# Altium footprint library Cty1.PcbLib: 1378 footprints (part 75 of 87)
Each footprint in its own frame and in the unit in brackets; x right, y up, seen from the top. Pads: shape width x height; smd on the part's side, far side on the other; paste and mask are expansions set on the pad; w line width, h text height; cw(c..) or ccw(c..) is an arc to the next point about the centre after c.
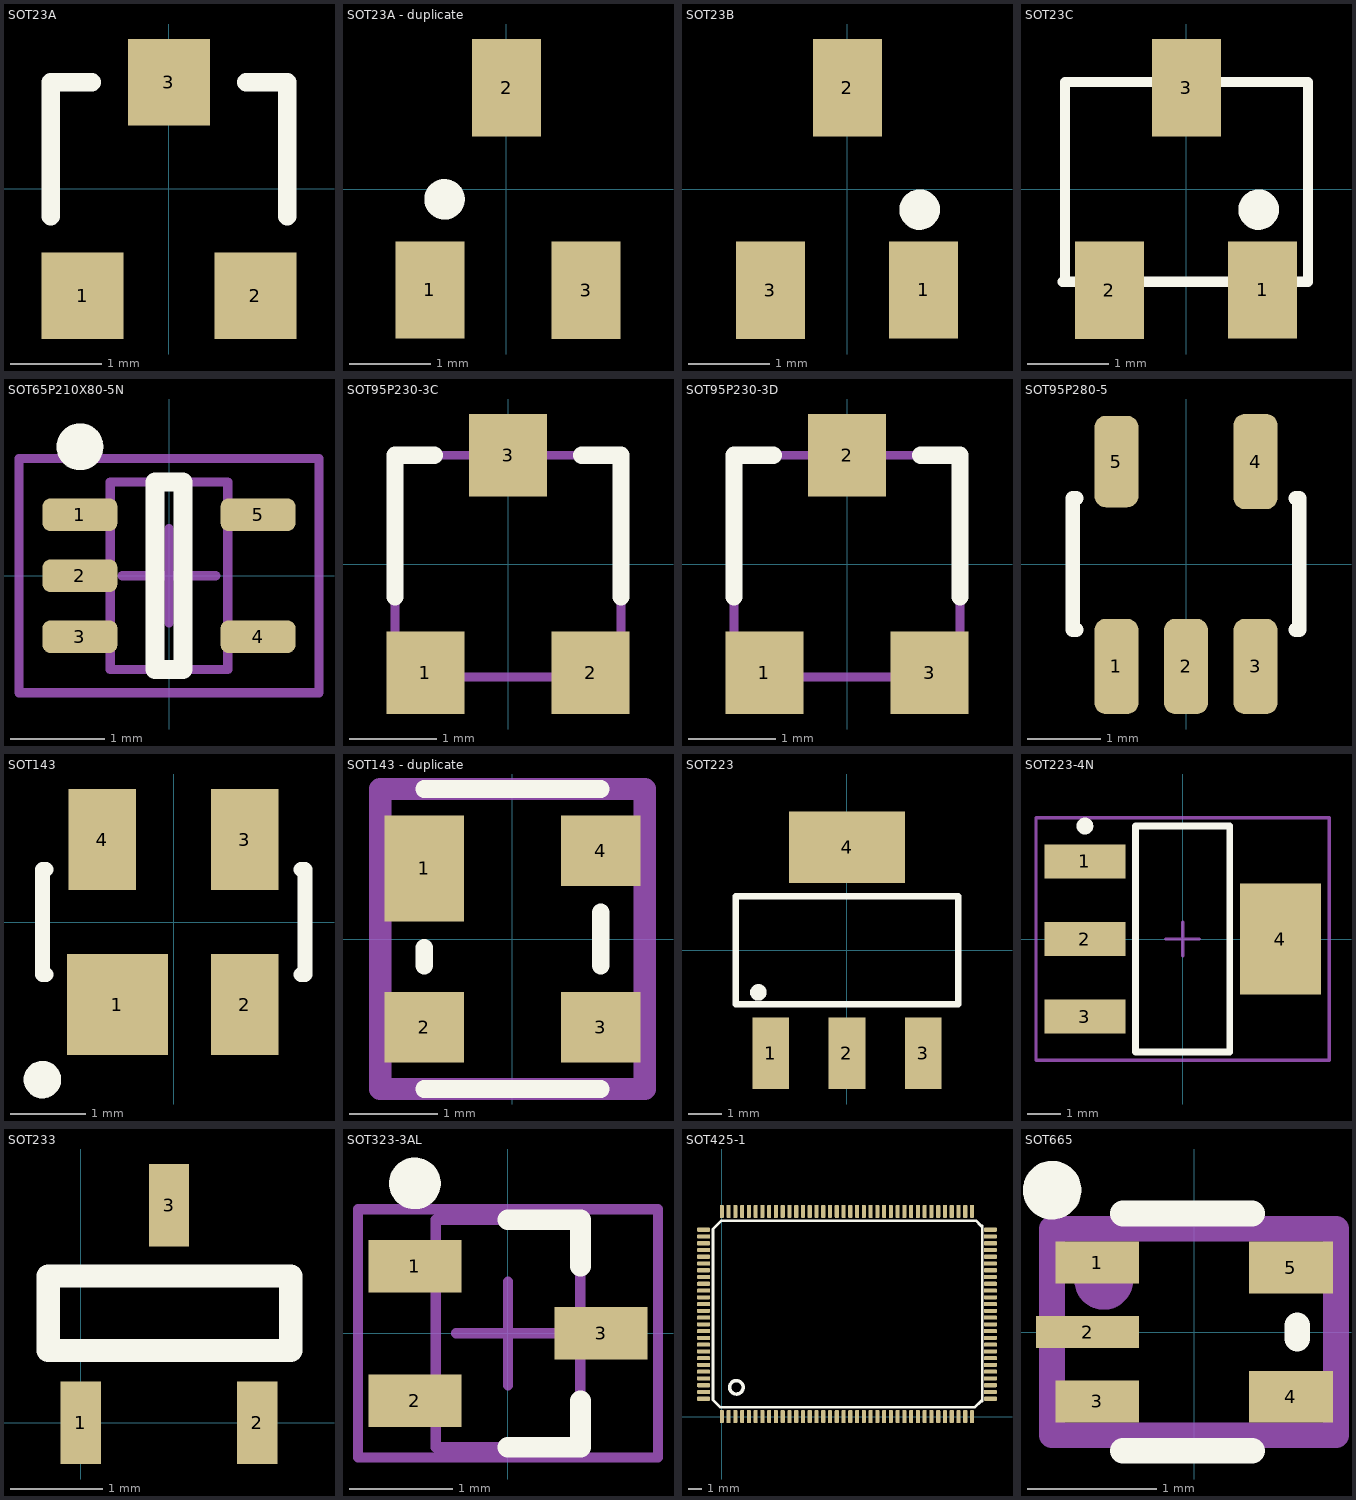
[diagram p74: the footprints below, top view; thin cyan lines are the x and y axes]

## SOT23A [mm] "SOT-23; 3 Leads; Body 3.0 x 2.5 mm, inc. leads (LxW max)"
height 1.2
pads (3):
  rect 0.9x0.95 smd: 1(-0.95,-1.175) 2(0.95,-1.175) 3(0,1.175)
Top Overlay:
  lines w0.2: -1.3,-0.3 -1.3,1.175 -0.85,1.175 ; 0.85,1.175 1.3,1.175 1.3,-0.3

## SOT23A - duplicate [mm] "SOT 23A"
height 1.27
pads (3):
  rect 0.85x1.2 smd: 1(-0.94,-1.245) 2(0.005,1.25) 3(0.985,-1.25)
Top Overlay:
  circle w0.25: c-0.76,-0.127 r0.125
3D body "SW3DPS-SOT-23-DEFAULT.STEP": height 1.06, standoff -0.04, extent -1.5,-1.301 1.5,1.199

## SOT23B [mm] "SOT 23B"
height 1.27
pads (3):
  rect 0.85x1.2 smd: 1(0.94,-1.245) 2(0,1.25) 3(-0.95,-1.25)
Top Overlay:
  circle w0.25: c0.891,-0.254 r0.125
3D body "SW3DPS-SOT-23-DEFAULT.STEP": height 1.06, standoff -0.04, extent -1.5,-1.301 1.5,1.199

## SOT23C [mm] "SOT 23C - 2-3-1 - BCE"
height 1.27
pads (3):
  rect 0.85x1.2 smd: 1(0.94,-1.245) 2(-0.95,-1.25) 3(0,1.25)
Top Overlay:
  circle w0.25: c0.891,-0.254 r0.125
  lines w0.127: -1.524,-1.143 -1.499,-1.143 -1.499,1.321 1.499,1.321 1.499,-1.143 -1.524,-1.143
3D body "SW3DPS-SOT-23-DEFAULT.STEP": height 1.06, standoff -0.04, extent -1.5,-1.174 1.5,1.326

## SOT65P210X80-5N [mm]
pads (5):
  rrect50% 0.8x0.35 smd: 1(-0.95,0.65) 2(-0.95,0) 3(-0.95,-0.65) 4(0.95,-0.65) 5(0.95,0.65)
Top Overlay:
  circle w0.25: c-0.95,1.375 r0.125
  lines w0.2: -0.15,-1 -0.15,1 0.15,1 0.15,-1 -0.15,-1
Mechanical 13:
  lines w0.1: -0.625,-1 -0.625,1 0.625,1 0.625,-1 -0.625,-1
Mechanical 15:
  lines w0.1: -0.5,0 0.5,0 ; 0,-0.5 0,0.5 ; -1.6,-1.25 -1.6,1.25 1.6,1.25 1.6,-1.25 -1.6,-1.25
3D body "SW3dPS-SOT280-5.STEP": height 0.57, standoff 0, extent -1.016,-0.993 0.902,0.993

## SOT95P230-3C [mm]
pads (3):
  rect 0.9x0.95 smd: 1(-0.95,-1.25) 2(0.95,-1.25) 3(0,1.25)
Top Overlay:
  lines w0.2: -1.3,-0.375 -1.3,1.25 -0.85,1.25 ; 0.85,1.25 1.3,1.25 1.3,-0.375
Mechanical 7:
  region: 1.225,-1.275 0.625,-1.275 0.625,-1.525 1.225,-1.525
  region: -0.625,-1.275 -1.225,-1.275 -1.225,-1.525 -0.625,-1.525
  rectangle: -0.3,1.25 0.3,1.5
  lines w0.1: -1.3,-1.3 1.3,-1.3 1.3,1.25 -1.3,1.25 -1.3,-1.3
  text ".Designator" at -1.2,0.75 h0.5
  text ".Comment" at -1.2,0.325 h0.5
3D body: height 0.13, standoff 0, extent -1.111,-1.175 -0.604,-0.465
3D body: height 0.38, standoff 0, extent -1.138,-0.465 1.174,0.73
3D body: height 0.13, standoff 0, extent 0.667,-1.175 1.174,-0.465
3D body: height 0.13, standoff 0, extent -0.236,0.73 0.271,1.44

## SOT95P230-3D [mm]
pads (3):
  rect 0.9x0.95 smd: 1(-0.95,-1.25) 2(0,1.25) 3(0.95,-1.25)
Top Overlay:
  lines w0.2: -1.3,-0.375 -1.3,1.25 -0.85,1.25 ; 0.85,1.25 1.3,1.25 1.3,-0.375
Mechanical 7:
  region: 1.225,-1.275 0.625,-1.275 0.625,-1.525 1.225,-1.525
  region: -0.625,-1.275 -1.225,-1.275 -1.225,-1.525 -0.625,-1.525
  rectangle: -0.3,1.25 0.3,1.5
  lines w0.1: -1.3,-1.3 1.3,-1.3 1.3,1.25 -1.3,1.25 -1.3,-1.3
  text ".Designator" at -1.2,0.75 h0.5
  text ".Comment" at -1.2,0.325 h0.5
3D body: height 0.13, standoff 0, extent -1.115,-1.254 -0.608,-0.543
3D body: height 0.38, standoff 0, extent -1.142,-0.543 1.171,0.651
3D body: height 0.13, standoff 0, extent 0.663,-1.254 1.17,-0.543
3D body: height 0.13, standoff 0, extent -0.239,0.651 0.268,1.362

## SOT95P280-5 [mm]
pads (5):
  rrect50% 0.6x1.3 smd: 1(-0.95,-1.4) 2(0,-1.4) 3(0.95,-1.4) 4(0.95,1.4)
  rrect50% 0.6x1.25 smd: 5(-0.95,1.4)
Top Overlay:
  lines w0.2: -1.5,-0.9 -1.55,-0.9 -1.55,0.9 -1.5,0.9 ; 1.5,-0.9 1.55,-0.9 1.55,0.9 1.5,0.9
3D body "SOT23-95P.STEP": height 0.77, standoff 0, extent -1.449,-1.45 1.45,1.35

## SOT143 [mm]
pads (4):
  rect 1.35x1.35 smd: 1(-0.75,-1.1)
  rect 0.9x1.35 smd: 2(0.95,-1.1) 3(0.95,1.1) 4(-0.95,1.1)
Top Overlay:
  circle w0.25: c-1.75,-2.1 r0.125
  lines w0.2: -1.7,-0.7 -1.75,-0.7 -1.75,0.7 -1.7,0.7 ; 1.7,-0.7 1.75,-0.7 1.75,0.7 1.7,0.7
3D body: height 0.2, standoff 0, extent 0.779,-1.464 1.125,-0.414
3D body: height 0.2, standoff 0, extent -1.166,-1.503 -0.82,-0.452
3D body: height 0.2, standoff 0, extent 0.784,0.408 1.13,1.459
3D body: height 0.2, standoff 0, extent -1.149,0.408 -0.803,1.459
3D body: height 0.8, standoff 0, extent -1.516,-0.878 1.514,0.931

## SOT143 - duplicate [mm]
pads (4):
  rect 0.9x1.2 smd: 1(-1,0.8)
  rect 0.9x0.8 smd: 2(-1,-1) 3(1,-1) 4(1,1)
Top Overlay:
  lines w0.2: -1,-1.7 1,-1.7 ; -1,-0.3 -1,-0.1 ; -1,1.7 1,1.7 ; 1,-0.3 1,0.3
Mechanical 16:
  circle w0.254: c-1,1.1 r0.1
  lines w0.254: -1.5,-1.7 1.5,-1.7 1.5,1.7 -1.5,1.7 -1.5,-1.7
Mechanical 29:
  text ".Designator" at -0.2,0.7 h0.6
3D body: height 1, standoff 0, extent -1,-1.7 1,1.7

## SOT223 [mm] "SOT-223/SC-73; 4 Leads; Body 6.7 x 7.3 mm, inc. leads (LxW max)"
height 1.8
pads (4):
  rect 1.1x2.15 smd: 1(-2.3,-3.1) 2(0,-3.1) 3(2.3,-3.1)
  rect 3.5x2.15 smd: 4(0,3.1)
Top Overlay:
  circle w0.25: c-2.665,-1.27 r0.125
  lines w0.2: -3.35,-1.625 -3.35,1.625 3.35,1.625 3.35,-1.625 -3.35,-1.625
3D body: height 2.54, standoff 0, extent -3.429,-1.651 3.429,1.651

## SOT223-4N [mm] "SOT223, 4-Leads, Body 6.5x3.5mm, Pitch 2.3mm, Lead Span 7mm, IPC Medium Density"
height 1.8
pads (4):
  rect 2.4x1 smd: 1(-2.9,2.3) 2(-2.9,0) 3(-2.9,-2.3)
  rect 2.4x3.3 smd: 4(2.9,0)
Top Overlay:
  circle w0.25: c-2.9,3.35 r0.125
  lines w0.2: -1.4,-3.35 1.4,-3.35 1.4,3.35 -1.4,3.35 -1.4,-3.35
Mechanical 15:
  lines w0.1: -0.5,0 0.5,0 ; 0,-0.5 0,0.5 ; -4.35,-3.6 4.35,-3.6 4.35,3.6 -4.35,3.6 -4.35,-3.6
3D body "SW3dPS-Regulator.STEP": height 1.72, standoff 0.02, extent -3.395,-3.274 3.496,3.226

## SOT233 [mm]
pads (3):
  rect 0.44x0.9 smd: 1(0,0) 2(1.92,0) 3(0.96,2.37)
Top Overlay:
  lines w0.254: -0.356,0.787 2.286,0.787 2.286,1.6 -0.356,1.6 -0.356,0.787
3D body "User Library-3-lead sot23-3.step": height 1.04, standoff 0.02, extent -0.495,-0.051 2.425,2.425

## SOT323-3AL [mm]
pads (3):
  rect 0.9x0.508 smd: 1(-0.9,0.65) 2(-0.9,-0.65) 3(0.9,0)
Top Overlay:
  circle w0.25: c-0.9,1.45 r0.125
  lines w0.2: 0,-1.1 0.7,-1.1 0.7,-0.65 ; 0,1.1 0.7,1.1 0.7,0.65
Mechanical 13:
  lines w0.1: -0.7,-1.1 0.7,-1.1 0.7,1.1 -0.7,1.1 -0.7,-1.1
Mechanical 15:
  lines w0.1: -0.5,0 0.5,0 ; 0,-0.5 0,0.5 ; -1.45,-1.2 1.45,-1.2 1.45,1.2 -1.45,1.2 -1.45,-1.2
3D body: height 1, standoff 0, extent -0.7,-1.1 0.7,1.1

## SOT425-1 [mm]
pads (128):
  rrect50% 0.305x0.975 smd mask+0.05: 1(0,0) 2(0.5,0) 3(1,0) 4(1.5,0) 5(2,0) 6(2.5,0) 7(3,0) 8(3.5,0) 9(4,0) 10(4.5,0) 11(5,0) 12(5.5,0) 13(6,0) 14(6.5,0) 15(7,0) 16(7.5,0) 17(8,0) 18(8.5,0) 19(9,0) 20(9.5,0) 21(10,0) 22(10.5,0) 23(11,0) 24(11.5,0) 25(12,0) 26(12.5,0) 27(13,0) 28(13.5,0) 29(14,0) 30(14.5,0) 31(15,0) 32(15.5,0) 33(16,0) 34(16.5,0) 35(17,0) 36(17.5,0) 37(18,0) 38(18.5,0) 65(18.5,15.172) 66(18,15.172) 67(17.5,15.172) 68(17,15.172) 69(16.5,15.172) 70(16,15.172) 71(15.5,15.172) 72(15,15.172) 73(14.5,15.172) 74(14,15.172) 75(13.5,15.172) 76(13,15.172) 77(12.5,15.172) 78(12,15.172) 79(11.5,15.172) 80(11,15.172) 81(10.5,15.172) 82(10,15.172) 83(9.5,15.172) 84(9,15.172) 85(8.5,15.172) 86(8,15.172) 87(7.5,15.172) 88(7,15.172) 89(6.5,15.172) 90(6,15.172) 91(5.5,15.172) 92(5,15.172) 93(4.5,15.172) 94(4,15.172) 95(3.5,15.172) 96(3,15.172) 97(2.5,15.172) 98(2,15.172) 99(1.5,15.172) 100(1,15.172) 101(0.5,15.172) 102(0,15.172)
  rrect50% 0.975x0.305 smd mask+0.05: 39(19.861,1.32) 40(19.861,1.82) 41(19.861,2.32) 42(19.861,2.82) 43(19.861,3.32) 44(19.861,3.82) 45(19.861,4.32) 46(19.861,4.82) 47(19.861,5.32) 48(19.861,5.82) 49(19.861,6.32) 50(19.861,6.82) 51(19.861,7.32) 52(19.861,7.82) 53(19.861,8.32) 54(19.861,8.82) 55(19.861,9.32) 56(19.861,9.82) 57(19.861,10.32) 58(19.861,10.82) 59(19.861,11.32) 60(19.861,11.82) 61(19.861,12.32) 62(19.861,12.82) 63(19.861,13.32) 64(19.861,13.82) 103(-1.35,13.82) 104(-1.35,13.32) 105(-1.35,12.82) 106(-1.35,12.32) 107(-1.35,11.82) 108(-1.35,11.32) 109(-1.35,10.82) 110(-1.35,10.32) 111(-1.35,9.82) 112(-1.35,9.32) 113(-1.35,8.82) 114(-1.35,8.32) 115(-1.35,7.82) 116(-1.35,7.32) 117(-1.35,6.82) 118(-1.35,6.32) 119(-1.35,5.82) 120(-1.35,5.32) 121(-1.35,4.82) 122(-1.35,4.32) 123(-1.35,3.82) 124(-1.35,3.32) 125(-1.35,2.82) 126(-1.35,2.32) 127(-1.35,1.82) 128(-1.35,1.32)
Top Overlay:
  circle w0.254: c1.075,2.165 r0.5
  lines w0.2: 19.183,1.167 18.7,0.684 -0.1,0.684 -0.656,1.24 -0.656,13.865 -0.034,14.487 18.797,14.487 19.183,14.101 ; 19.261,1.156 19.261,14.09
3D body "pinset.stp": height 0.69, standoff -0.02, extent 18.985,1.19 20.196,1.46
3D body "pinset.stp": height 0.69, standoff -0.02, extent 18.985,1.69 20.196,1.96
3D body "pinset.stp": height 0.69, standoff -0.02, extent 18.985,2.19 20.196,2.46
3D body "pinset.stp": height 0.69, standoff -0.02, extent 18.985,2.69 20.196,2.96
3D body "pinset.stp": height 0.69, standoff -0.02, extent -1.672,2.69 -0.461,2.96
3D body "pinset.stp": height 0.69, standoff -0.02, extent -1.672,2.19 -0.461,2.46
3D body "pinset.stp": height 0.69, standoff -0.02, extent -1.672,1.69 -0.461,1.96
3D body "pinset.stp": height 0.69, standoff -0.02, extent -1.672,1.19 -0.461,1.46
3D body "pinset.stp": height 0.69, standoff -0.02, extent 18.368,14.325 18.638,15.536
3D body "pinset.stp": height 0.69, standoff -0.02, extent 17.868,14.325 18.138,15.536
3D body "pinset.stp": height 0.69, standoff -0.02, extent 17.368,14.325 17.638,15.536
3D body "pinset.stp": height 0.69, standoff -0.02, extent 16.868,14.325 17.138,15.536
3D body "pinset.stp": height 0.69, standoff -0.02, extent 16.368,14.325 16.638,15.536
3D body "pinset.stp": height 0.69, standoff -0.02, extent 15.868,14.325 16.138,15.536
3D body "pinset.stp": height 0.69, standoff -0.02, extent 15.368,14.325 15.638,15.536
3D body "pinset.stp": height 0.69, standoff -0.02, extent 14.868,14.325 15.138,15.536
3D body "pinset.stp": height 0.69, standoff -0.02, extent 14.368,14.325 14.638,15.536
3D body "pinset.stp": height 0.69, standoff -0.02, extent 13.868,14.325 14.138,15.536
3D body "pinset.stp": height 0.69, standoff -0.02, extent 13.368,14.325 13.638,15.536
3D body "pinset.stp": height 0.69, standoff -0.02, extent 7.868,14.325 8.138,15.536
3D body "pinset.stp": height 0.69, standoff -0.02, extent 8.368,14.325 8.638,15.536
3D body "pinset.stp": height 0.69, standoff -0.02, extent 8.868,14.325 9.138,15.536
3D body "pinset.stp": height 0.69, standoff -0.02, extent 9.368,14.325 9.638,15.536
3D body "pinset.stp": height 0.69, standoff -0.02, extent 9.868,14.325 10.138,15.536
3D body "pinset.stp": height 0.69, standoff -0.02, extent 10.368,14.325 10.638,15.536
3D body "pinset.stp": height 0.69, standoff -0.02, extent 10.868,14.325 11.138,15.536
3D body "pinset.stp": height 0.69, standoff -0.02, extent 11.368,14.325 11.638,15.536
3D body "pinset.stp": height 0.69, standoff -0.02, extent 11.868,14.325 12.138,15.536
3D body "pinset.stp": height 0.69, standoff -0.02, extent 12.368,14.325 12.638,15.536
3D body "pinset.stp": height 0.69, standoff -0.02, extent 12.868,14.325 13.138,15.536
3D body "pinset.stp": height 0.69, standoff -0.02, extent 7.371,14.323 7.641,15.534
3D body "pinset.stp": height 0.69, standoff -0.02, extent 6.871,14.323 7.141,15.534
3D body "pinset.stp": height 0.69, standoff -0.02, extent 6.371,14.323 6.641,15.534
3D body "pinset.stp": height 0.69, standoff -0.02, extent 5.871,14.323 6.141,15.534
3D body "pinset.stp": height 0.69, standoff -0.02, extent 5.371,14.323 5.641,15.534
3D body "pinset.stp": height 0.69, standoff -0.02, extent 4.871,14.323 5.141,15.534
3D body "pinset.stp": height 0.69, standoff -0.02, extent 4.371,14.323 4.641,15.534
3D body "pinset.stp": height 0.69, standoff -0.02, extent 3.871,14.323 4.141,15.534
3D body "pinset.stp": height 0.69, standoff -0.02, extent 3.371,14.323 3.641,15.534
3D body "pinset.stp": height 0.69, standoff -0.02, extent 2.871,14.323 3.141,15.534
3D body "pinset.stp": height 0.69, standoff -0.02, extent 2.371,14.323 2.641,15.534
3D body "pinset.stp": height 0.69, standoff -0.02, extent -0.129,14.323 0.141,15.534
3D body "pinset.stp": height 0.69, standoff -0.02, extent 0.371,14.323 0.641,15.534
3D body "pinset.stp": height 0.69, standoff -0.02, extent 0.871,14.323 1.141,15.534
3D body "pinset.stp": height 0.69, standoff -0.02, extent 1.371,14.323 1.641,15.534
3D body "pinset.stp": height 0.69, standoff -0.02, extent 1.871,14.323 2.141,15.534
3D body "pinset.stp": height 0.69, standoff -0.02, extent 16.367,-0.337 16.637,0.875
3D body "pinset.stp": height 0.69, standoff -0.02, extent 16.867,-0.337 17.137,0.875
3D body "pinset.stp": height 0.69, standoff -0.02, extent 17.367,-0.337 17.637,0.875
3D body "pinset.stp": height 0.69, standoff -0.02, extent 17.867,-0.337 18.137,0.875
3D body "pinset.stp": height 0.69, standoff -0.02, extent 18.367,-0.337 18.637,0.875
3D body "pinset.stp": height 0.69, standoff -0.02, extent 15.867,-0.337 16.137,0.875
3D body "pinset.stp": height 0.69, standoff -0.02, extent 15.367,-0.337 15.637,0.875
3D body "pinset.stp": height 0.69, standoff -0.02, extent 14.867,-0.337 15.137,0.875
3D body "pinset.stp": height 0.69, standoff -0.02, extent 14.367,-0.337 14.637,0.875
3D body "pinset.stp": height 0.69, standoff -0.02, extent 13.867,-0.337 14.137,0.875
3D body "pinset.stp": height 0.69, standoff -0.02, extent 13.367,-0.337 13.637,0.875
3D body "pinset.stp": height 0.69, standoff -0.02, extent 12.867,-0.337 13.137,0.875
3D body "pinset.stp": height 0.69, standoff -0.02, extent 12.367,-0.337 12.637,0.875
3D body "pinset.stp": height 0.69, standoff -0.02, extent 11.867,-0.337 12.137,0.875
3D body "pinset.stp": height 0.69, standoff -0.02, extent 11.367,-0.337 11.637,0.875
3D body "pinset.stp": height 0.69, standoff -0.02, extent 10.867,-0.337 11.137,0.875
3D body "pinset.stp": height 0.69, standoff -0.02, extent 5.37,-0.339 5.64,0.873
3D body "pinset.stp": height 0.69, standoff -0.02, extent 5.87,-0.339 6.14,0.873
3D body "pinset.stp": height 0.69, standoff -0.02, extent 6.37,-0.339 6.64,0.873
3D body "pinset.stp": height 0.69, standoff -0.02, extent 6.87,-0.339 7.14,0.873
3D body "pinset.stp": height 0.69, standoff -0.02, extent 7.37,-0.339 7.64,0.873
3D body "pinset.stp": height 0.69, standoff -0.02, extent 7.87,-0.339 8.14,0.873
3D body "pinset.stp": height 0.69, standoff -0.02, extent 8.37,-0.339 8.64,0.873
3D body "pinset.stp": height 0.69, standoff -0.02, extent 8.87,-0.339 9.14,0.873
3D body "pinset.stp": height 0.69, standoff -0.02, extent 9.37,-0.339 9.64,0.873
3D body "pinset.stp": height 0.69, standoff -0.02, extent 9.87,-0.339 10.14,0.873
3D body "pinset.stp": height 0.69, standoff -0.02, extent 10.37,-0.339 10.64,0.873
3D body "pinset.stp": height 0.69, standoff -0.02, extent 4.87,-0.339 5.14,0.873
3D body "pinset.stp": height 0.69, standoff -0.02, extent 4.37,-0.339 4.64,0.873
3D body "pinset.stp": height 0.69, standoff -0.02, extent 3.87,-0.339 4.14,0.873
3D body "pinset.stp": height 0.69, standoff -0.02, extent 3.37,-0.339 3.64,0.873
3D body "pinset.stp": height 0.69, standoff -0.02, extent 2.87,-0.339 3.14,0.873
3D body "pinset.stp": height 0.69, standoff -0.02, extent 2.37,-0.339 2.64,0.873
3D body "pinset.stp": height 0.69, standoff -0.02, extent 1.87,-0.339 2.14,0.873
3D body "pinset.stp": height 0.69, standoff -0.02, extent 1.37,-0.339 1.64,0.873
3D body "pinset.stp": height 0.69, standoff -0.02, extent 0.87,-0.339 1.14,0.873
3D body "pinset.stp": height 0.69, standoff -0.02, extent 0.37,-0.339 0.64,0.873
3D body "pinset.stp": height 0.69, standoff -0.02, extent -0.13,-0.339 0.14,0.873
3D body "pinset.stp": height 0.69, standoff -0.02, extent -1.658,8.195 -0.447,8.465
3D body "pinset.stp": height 0.69, standoff -0.02, extent -1.658,7.695 -0.447,7.965
3D body "pinset.stp": height 0.69, standoff -0.02, extent -1.658,7.195 -0.447,7.465
3D body "pinset.stp": height 0.69, standoff -0.02, extent -1.658,6.695 -0.447,6.965
3D body "pinset.stp": height 0.69, standoff -0.02, extent -1.658,6.195 -0.447,6.465
3D body "pinset.stp": height 0.69, standoff -0.02, extent -1.658,5.695 -0.447,5.965
3D body "pinset.stp": height 0.69, standoff -0.02, extent -1.658,5.195 -0.447,5.465
3D body "pinset.stp": height 0.69, standoff -0.02, extent -1.658,4.695 -0.447,4.965
3D body "pinset.stp": height 0.69, standoff -0.02, extent -1.658,4.195 -0.447,4.465
3D body "pinset.stp": height 0.69, standoff -0.02, extent -1.658,3.695 -0.447,3.965
3D body "pinset.stp": height 0.69, standoff -0.02, extent -1.658,3.195 -0.447,3.465
3D body "pinset.stp": height 0.69, standoff -0.02, extent -1.658,8.695 -0.447,8.965
3D body "pinset.stp": height 0.69, standoff -0.02, extent -1.658,9.195 -0.447,9.465
3D body "pinset.stp": height 0.69, standoff -0.02, extent -1.658,9.695 -0.447,9.965
3D body "pinset.stp": height 0.69, standoff -0.02, extent -1.658,10.195 -0.447,10.465
3D body "pinset.stp": height 0.69, standoff -0.02, extent -1.658,10.695 -0.447,10.965
3D body "pinset.stp": height 0.69, standoff -0.02, extent -1.658,11.195 -0.447,11.465
3D body "pinset.stp": height 0.69, standoff -0.02, extent -1.658,11.695 -0.447,11.965
3D body "pinset.stp": height 0.69, standoff -0.02, extent -1.658,12.195 -0.447,12.465
3D body "pinset.stp": height 0.69, standoff -0.02, extent -1.658,12.695 -0.447,12.965
3D body "pinset.stp": height 0.69, standoff -0.02, extent -1.658,13.195 -0.447,13.465
3D body "pinset.stp": height 0.69, standoff -0.02, extent -1.658,13.695 -0.447,13.965
3D body "pinset.stp": height 0.69, standoff -0.02, extent 18.988,3.175 20.199,3.445
3D body "pinset.stp": height 0.69, standoff -0.02, extent 18.988,3.675 20.199,3.945
3D body "pinset.stp": height 0.69, standoff -0.02, extent 18.988,4.175 20.199,4.445
3D body "pinset.stp": height 0.69, standoff -0.02, extent 18.988,4.675 20.199,4.945
3D body "pinset.stp": height 0.69, standoff -0.02, extent 18.988,5.175 20.199,5.445
3D body "pinset.stp": height 0.69, standoff -0.02, extent 18.988,5.675 20.199,5.945
3D body "pinset.stp": height 0.69, standoff -0.02, extent 18.988,6.175 20.199,6.445
3D body "pinset.stp": height 0.69, standoff -0.02, extent 18.988,6.675 20.199,6.945
3D body "pinset.stp": height 0.69, standoff -0.02, extent 18.988,7.175 20.199,7.445
3D body "pinset.stp": height 0.69, standoff -0.02, extent 18.988,7.675 20.199,7.945
3D body "pinset.stp": height 0.69, standoff -0.02, extent 18.988,8.175 20.199,8.445
3D body "pinset.stp": height 0.69, standoff -0.02, extent 18.988,13.675 20.199,13.945
3D body "pinset.stp": height 0.69, standoff -0.02, extent 18.988,13.175 20.199,13.445
3D body "pinset.stp": height 0.69, standoff -0.02, extent 18.988,12.675 20.199,12.945
3D body "pinset.stp": height 0.69, standoff -0.02, extent 18.988,12.175 20.199,12.445
3D body "pinset.stp": height 0.69, standoff -0.02, extent 18.988,11.675 20.199,11.945
3D body "pinset.stp": height 0.69, standoff -0.02, extent 18.988,11.175 20.199,11.445
3D body "pinset.stp": height 0.69, standoff -0.02, extent 18.988,10.675 20.199,10.945
3D body "pinset.stp": height 0.69, standoff -0.02, extent 18.988,10.175 20.199,10.445
3D body "pinset.stp": height 0.69, standoff -0.02, extent 18.988,9.675 20.199,9.945
3D body "pinset.stp": height 0.69, standoff -0.02, extent 18.988,9.175 20.199,9.445
3D body "pinset.stp": height 0.69, standoff -0.02, extent 18.988,8.675 20.199,8.945
3D body: height 1.6, standoff 0, extent -0.764,0.603 19.263,14.574
3D body: height 1.61, standoff 1.55, extent 0.502,1.582 1.61,2.689

## SOT665 [mm] "Creator MM"
height 0.6
pads (5):
  rect 0.65x0.325 smd mask+0.05: 1(-0.75,0.538) 3(-0.75,-0.538)
  rect 0.8x0.25 smd mask+0.05: 2(-0.825,0)
  rect 0.65x0.4 smd mask+0.05: 4(0.75,-0.5) 5(0.75,0.5)
Top Overlay:
  circle w0.254: c-1.1,1.1 r0.1
  lines w0.2: -0.55,-0.92 0.45,-0.92 ; -0.55,0.92 0.45,0.92 ; 0.8,-0.05 0.8,0.05
Mechanical 16:
  circle w0.254: c-0.7,0.4 r0.1
  lines w0.2: -1.1,-0.8 -1.1,0.8 1.1,0.8 1.1,-0.8 -1.1,-0.8
Mechanical 29:
  text ".Designator" at 0,0.3 h0.4
3D body "SOT50P160X60-5.step": height 0.6, standoff 0, extent -0.8,-0.795 0.8,0.795